# Altium footprint library 04.连接器件.pcb.PCBLIB: 363 footprints (part 1 of 23) (continued)
## 1P - 方形 - 下缺 [mm] "触摸按键" (continued)
  rectangle: 5.004,-4.494 5.111,-4.235
  rectangle: 5.089,-4.422 5.201,-4.247
  rectangle: 5.331,-4.064 5.534,-3.873
  rectangle: 5.22,-4.19 5.41,-3.869
  rectangle: 5.393,-4.122 5.466,-4.039
  rectangle: 5.631,-3.571 6.046,-3.201
  rectangle: 6.009,-3.471 6.169,-3.21
  rectangle: 6.146,-3.343 6.277,-3.219
  rectangle: 5.66,-3.735 5.889,-3.542
  rectangle: 5.849,-3.641 5.958,-3.528
  rectangle: 5.66,-3.833 5.795,-3.735
  rectangle: 5.48,-3.994 5.606,-3.851
  rectangle: 4.103,-5.182 4.417,-4.895
  rectangle: 4.133,-5.33 4.332,-5.164
  rectangle: 4.371,-5.097 4.567,-4.926
  rectangle: 5.09,-3.275 6.333,-2.98
  lines w0.127: -6.45,-1.651 -6.45,-1.884 ; -6.395,-2.522 -6.395,-2.691 ; -4.064,-5.33 -4.123,-5.33 -5.655,-3.797 -6.395,-3.058 -6.395,-2.951 ; -2.423,-5.408 -2.926,-5.408 ; 6.423,-3.174 4.188,-5.408 -4.216,-5.408 ; -6.45,-2.485 -6.45,-3.174 -5.105,-4.519 -4.216,-5.408 ; -6.45,-2.485 -6.45,-1.884 ; -6.45,-2.485 -5.803,-3.132 -3.527,-5.408 ; -6.45,-1.884 -2.926,-5.408 ; -6.395,-2.951 -5.424,-3.921 -3.98,-5.366 -3.856,-5.366 ; -6.395,-2.951 -6.395,-2.827 ; -6.395,-2.827 -5.62,-3.602 -3.856,-5.366 ; -6.395,-2.827 -6.395,-2.691 ; -6.395,-2.691 -5.777,-3.309 -3.72,-5.366 -3.608,-5.366 -3.856,-5.366 ; -4.216,-5.408 -3.527,-5.408 ; -3.527,-5.408 -2.926,-5.408
  lines w0.4: 1.851,-4.532 ccw(c1.93,-3.996) 2.465,-4.075 ; 1.865,-4.486 ccw(c2.102,-3.687) 2.901,-3.924 ; 2.159,-4.438 ccw(c2.491,-3.288) 3.641,-3.621
  lines w0.5: -3.483,-0.201 cw(c0.424,-0.023) 0.246,3.883 ; -3.48,-0.798 ccw(c0.466,-0.45) 0.814,-4.396 ; -3.124,2.795 ccw(c0.928,0.061) -1.024,-4.42 ; -2.598,2.95 cw(c0.025,0.527) -1.554,3.73 ; -1.271,3.929 ccw(c0.722,-0.156) -1.073,-4.333 ; -0.124,3.872 cw(c-0.367,0.086) 3.42,-0.157 ; 0.549,3.954 cw(c-0.023,0.556) 2.921,2.346 ; 0.766,-4.196 ccw(c-0.479,-0.476) 3.431,-0.154 ; 1.357,4.002 cw(c-1.014,-0.135) 1.616,-4.112 ; 2.921,2.363 cw(c-0.852,-0.254) 3.701,-0.848
  lines w0.8: -3.647,0.584 cw(c-0.022,0.275) 3.555,0.943 ; -3.628,1.459 -3.628,-1.477 -3.598,-1.507 ; -3.594,-1.407 ccw(c-0.017,-0.739) 3.591,-1.212 ; -2.117,-4.668 -2.062,-4.723 1.933,-4.723 ; -2.102,4.087 -1.93,4.259 1.838,4.259 ; 3.436,1.807 3.59,1.653 3.59,-1.226

## 1P - 方形 - 右下缺 [mm] "触摸按键"
TopLayer:
  circle w0.4: c0.273,-0.163 r4.195
  region: 4.495,-3.908 4.324,-3.908 4.324,-4.075 4.495,-4.075
  region: 4.829,-3.597 4.675,-3.597 4.675,-3.705 4.829,-3.705
  region: 4.925,-3.507 4.682,-3.507 4.682,-3.615 4.925,-3.615
  region: 4.993,-3.419 4.69,-3.419 4.69,-3.526 4.993,-3.526
  region: 4.709,-3.696 4.526,-3.696 4.526,-3.866 4.709,-3.866
  region: 4.575,-3.645 4.306,-3.645 4.306,-3.936 4.575,-3.936
  region: 3.685,-4.759 3.502,-4.759 3.502,-4.868 3.685,-4.868
  region: 3.817,-4.573 3.679,-4.573 3.679,-4.734 3.817,-4.734
  region: 3.725,-4.589 3.536,-4.589 3.536,-4.783 3.725,-4.783
  region: 4.084,-4.341 3.936,-4.341 3.936,-4.448 4.084,-4.448
  region: 4.199,-4.213 3.941,-4.213 3.941,-4.364 4.199,-4.364
  region: 4.28,-4.138 4.199,-4.138 4.199,-4.213 4.28,-4.213
  region: 4.246,-3.993 3.857,-3.993 3.857,-4.278 4.246,-4.278
  region: 4.369,-3.802 4.07,-3.802 4.07,-4.167 4.369,-4.167
  region: 3.959,-4.447 3.891,-4.447 3.891,-4.534 3.959,-4.534
  region: 3.912,-4.056 3.446,-4.056 3.446,-4.629 3.912,-4.629
  region: 3.996,-4.138 3.727,-4.138 3.727,-4.493 3.996,-4.493
  region: 3.199,-5.206 2.746,-5.206 2.746,-5.349 3.199,-5.349
  region: 3.496,-4.925 3.482,-4.925 3.482,-4.966 3.496,-4.966
  region: 3.467,-4.913 3.219,-4.913 3.219,-5.139 3.467,-5.139
  region: 3.307,-4.874 2.591,-4.874 2.591,-5.262 3.307,-5.262
  region: 3.564,-4.283 2.733,-4.283 2.733,-4.96 3.564,-4.96
  region: 5.249,-3.154 5.037,-3.154 5.037,-3.33 5.249,-3.33
  region: 5.484,-2.947 5.321,-2.947 5.321,-3.067 5.484,-3.067
  region: 5.605,-2.836 5.421,-2.836 5.421,-2.947 5.605,-2.947
  region: 5.672,-2.742 5.414,-2.742 5.414,-2.849 5.672,-2.849
  region: 5.733,-2.578 5.347,-2.578 5.347,-2.771 5.733,-2.771
  region: 6.321,-2.077 6.163,-2.077 6.163,-2.237 6.321,-2.237
  region: 6.202,-2.063 5.972,-2.063 5.972,-2.378 6.202,-2.378
  region: 5.852,-2.578 5.733,-2.578 5.733,-2.667 5.852,-2.667
  region: 5.943,-2.481 5.679,-2.481 5.679,-2.603 5.943,-2.603
  region: 6.053,-2.044 5.673,-2.044 5.673,-2.51 6.053,-2.51
  region: 6.522,-1.896 6.347,-1.896 6.347,-2.053 6.522,-2.053
  region: 6.698,-1.497 6.513,-1.497 6.513,-1.852 6.698,-1.852
  region: 6.597,-1.563 6.399,-1.563 6.399,-1.948 6.597,-1.948
  region: 6.399,-1.563 5.639,-1.563 5.639,-2.112 6.399,-2.112
  region: 2.431,-4.533 -1.735,-4.533 -1.735,-4.699 2.431,-4.699
  region: 2.382,4.388 -1.88,4.388 -1.88,4.092 2.382,4.092
  region: 2.316,-4.663 2.316,-4.168 -1.728,-4.168 -1.728,-4.663
  region: 3.641,-4.306 3.641,-3.766 2.06,-3.766 2.06,-4.306
  region: 5.107,-3.451 5.107,-2.889 3.248,-2.889 3.248,-3.451
  region: 5.367,-3.182 5.367,-2.616 3.672,-2.616 3.672,-3.182
  region: 4.156,-2.698 4.156,-2.419 3.837,-2.419 3.837,-2.698
  region: 4.782,-2.173 4.782,-1.743 4.207,-1.743 4.207,-2.173
  region: 4.768,-1.871 4.768,-0.775 4.339,-0.775 4.339,-1.871
  region: 5.49,-2.968 5.49,-2.712 5.293,-2.712 5.293,-2.968
  region: 4.339,-3.862 4.339,-3.369 2.823,-3.369 2.823,-3.862
  region: 4.741,-3.739 4.741,-3.346 4.248,-3.346 4.248,-3.739
  region: 4.125,-4.072 4.125,-3.652 3.526,-3.652 3.526,-4.072
  region: 2.919,-3.835 2.919,-3.657 2.718,-3.657 2.718,-3.835
  region: 4.764,0.636 4.764,3.289 4.289,3.289 4.289,0.636
  region: 4.841,0.289 4.841,0.974 4.426,0.974 4.426,0.289
  region: 5.499,1.919 5.499,2.705 4.691,2.705 4.691,1.919
  region: 5.262,2.613 5.262,3.152 4.617,3.152 4.617,2.613
  region: 4.343,1.869 4.343,3.792 3.782,3.792 3.782,1.869
  region: 4.422,1.508 4.422,2.011 4.102,2.011 4.102,1.508
  region: 4.617,3.152 4.617,3.499 4.166,3.499 4.166,3.152
  region: -3.799,0.96 -3.799,1.417 -4.155,1.417 -4.155,0.96
  region: -3.201,-2.785 -3.201,-2.36 -5.187,-2.36 -5.187,-2.785
  region: -2.927,-3.15 -2.927,-2.744 -4.941,-2.744 -4.941,-3.15
  region: -2.534,-3.556 -2.534,-3.104 -4.589,-3.104 -4.589,-3.556
  region: -2.201,-3.753 -2.201,-3.552 -4.091,-3.552 -4.091,-3.753
  region: -2.128,-3.885 -2.128,-3.579 -3.749,-3.579 -3.749,-3.885
  region: -1.808,-4.064 -1.808,-3.748 -3,-3.748 -3,-4.064
  region: -2.406,-3.579 -2.406,-3.488 -2.694,-3.488 -2.694,-3.579
  region: -1.351,-4.168 -1.351,-4.004 -1.867,-4.004 -1.867,-4.168
  region: -1.529,-4.401 -1.529,-3.922 -2.141,-3.922 -2.141,-4.401
  region: -3.425,1.933 -3.425,2.69 -5.231,2.69 -5.231,1.933
  region: -3.137,2.248 -3.137,2.764 -5.041,2.764 -5.041,2.248
  region: -3.278,2.079 -3.278,2.335 -3.493,2.335 -3.493,2.079
  region: -2.648,2.668 -2.648,3.116 -4.717,3.116 -4.717,2.668
  region: -2.927,2.509 -2.927,2.828 -3.292,2.828 -3.292,2.509
  region: -2.342,3.024 -2.342,3.413 -4.224,3.413 -4.224,3.024
  region: -1.753,3.308 -1.753,3.773 -3.927,3.773 -3.927,3.308
  region: -1.315,3.645 -1.315,3.956 -3.027,3.956 -3.027,3.645
  region: 2.298,3.938 2.298,4.335 -1.767,4.335 -1.767,3.938
  region: 3.837,2.545 3.837,3.995 3.239,3.995 3.239,2.545
  region: 3.887,2.401 3.887,2.673 3.686,2.673 3.686,2.401
  region: 2.901,3.81 2.901,4.162 1.845,4.162 1.845,3.81
  region: 3.353,3.691 3.353,4.002 2.129,4.002 2.129,3.691
  region: 3.334,3.147 3.334,3.883 2.613,3.883 2.613,3.147
  region: 2.713,3.463 2.713,3.938 2.298,3.938 2.298,3.463
  region: 3.389,2.988 3.389,3.266 3.115,3.266 3.115,2.988
  region: 3.442,3.828 3.442,4.152 2.796,4.152 2.796,3.828
  region: 5.769,5.098 4,5.098 4,-2.7 5.769,-2.7
  region: -3.485,1.933 -5.231,1.933 -5.231,-3.045 -3.485,-3.045
  region: 4.001,5.097 1.483,5.097 1.483,3.634 4.001,3.634
  region: 1.715,5.097 -5.231,5.097 -5.231,3.935 1.715,3.935
  region: -2.91,3.935 -5.231,3.935 -5.231,2.69 -2.91,2.69
  region: 2.792,-3.884 1.814,-3.884 1.814,-5.401 2.792,-5.401
  region: 1.814,-4.138 -4.235,-4.138 -4.235,-5.401 1.814,-5.401
  region: -4.235,-3.045 -5.231,-3.045 -5.231,-5.401 -4.235,-5.401
  region: -3.037,-3.166 -4.561,-3.166 -4.561,-4.458 -3.037,-4.458
  region: -5.231,5.098 -6.231,5.098 -6.231,-5.401 -5.231,-5.401
  region: 6.769,5.098 5.769,5.098 5.769,-1.625 6.769,-1.625
  region: 6.674,-1.925 6.121,-1.925 6.121,-2.495 6.674,-2.495
  region: 6.538,-2.467 5.986,-2.467 5.986,-2.58 6.538,-2.58
  region: 6.463,-2.553 5.906,-2.553 5.906,-2.701 6.463,-2.701
  region: 6.341,-2.68 5.827,-2.68 5.827,-2.822 6.341,-2.822
  region: 6.241,-2.794 5.682,-2.794 5.682,-2.942 6.241,-2.942
  region: 5.874,-2.745 5.785,-2.745 5.785,-2.813 5.874,-2.813
  region: 4.967,-3.599 4.351,-3.599 4.351,-4.217 4.967,-4.217
  region: 5.411,-3.108 4.919,-3.108 4.919,-3.794 5.411,-3.794
  region: 5.798,-2.865 5.291,-2.865 5.291,-3.325 5.798,-3.325
  region: 5.717,-3.306 5.353,-3.306 5.353,-3.386 5.717,-3.386
  region: 5.65,-3.376 5.379,-3.376 5.379,-3.459 5.65,-3.459
  region: 5.584,-3.451 5.375,-3.451 5.375,-3.518 5.584,-3.518
  region: 5.522,-3.507 5.36,-3.507 5.36,-3.589 5.522,-3.589
  region: 5.489,-3.57 5.36,-3.57 5.36,-3.589 5.489,-3.589
  region: 5.459,-3.579 5.363,-3.579 5.363,-3.642 5.459,-3.642
  region: 6.083,-2.897 5.761,-2.897 5.761,-3.014 6.083,-3.014
  region: 6.031,-2.992 5.762,-2.992 5.762,-3.058 6.031,-3.058
  region: 5.984,-3.046 5.764,-3.046 5.764,-3.114 5.984,-3.114
  region: 5.926,-3.107 5.757,-3.107 5.757,-3.177 5.926,-3.177
  region: 5.89,-3.159 5.755,-3.159 5.755,-3.239 5.89,-3.239
  region: 6.125,-2.897 6.083,-2.897 6.083,-2.961 6.125,-2.961
  region: 5.278,-3.76 4.914,-3.76 4.914,-3.895 5.278,-3.895
  region: 5.164,-3.873 4.906,-3.873 4.906,-3.966 5.164,-3.966
  region: 5.098,-3.944 4.875,-3.944 4.875,-4.074 5.098,-4.074
  region: 4.816,-4.194 4.199,-4.194 4.199,-4.364 4.816,-4.364
  region: 4.683,-4.343 4.091,-4.343 4.091,-4.482 4.683,-4.482
  region: 4.565,-4.463 4.03,-4.463 4.03,-4.571 4.565,-4.571
  region: 4.483,-4.555 3.899,-4.555 3.899,-4.692 4.483,-4.692
  region: 4.343,-4.672 3.783,-4.672 3.783,-4.805 4.343,-4.805
  region: 4.243,-4.787 3.678,-4.787 3.678,-4.9 4.243,-4.9
  region: 4.153,-4.88 3.604,-4.88 3.604,-4.984 4.153,-4.984
  region: 4.058,-4.97 3.484,-4.97 3.484,-5.107 4.058,-5.107
  region: 3.946,-5.09 3.375,-5.09 3.375,-5.203 3.946,-5.203
  region: 3.843,-5.182 3.298,-5.182 3.298,-5.305 3.843,-5.305
  lines w0.127: 2.678,-5.337 3.181,-5.337 ; 4.319,-5.259 4.378,-5.259 5.911,-3.726 6.651,-2.987 6.651,-2.88 ; 6.651,-2.451 6.651,-2.62 ; 6.706,-1.58 6.706,-1.813 ; 3.181,-5.337 6.706,-1.813 ; 3.181,-5.337 3.782,-5.337 ; 3.782,-5.337 4.471,-5.337 5.36,-4.448 6.706,-3.103 6.706,-2.414 ; 3.782,-5.337 6.059,-3.061 6.706,-2.414 ; 4.112,-5.295 4.236,-5.295 5.68,-3.85 6.651,-2.88 ; 4.112,-5.295 3.863,-5.295 3.976,-5.295 6.032,-3.238 6.651,-2.62 ; 4.112,-5.295 5.875,-3.531 6.651,-2.756 ; 6.651,-2.88 6.651,-2.756 ; 6.651,-2.756 6.651,-2.62 ; 6.706,-2.414 6.706,-1.813
  lines w0.4: -3.386,-3.55 ccw(c-2.236,-3.217) -1.904,-4.367 ; -2.646,-3.853 ccw(c-1.847,-3.616) -1.609,-4.415 ; -2.21,-4.004 ccw(c-1.674,-3.925) -1.595,-4.461
  lines w0.5: -3.446,-0.777 cw(c1.107,-0.183) -2.665,2.434 ; -3.175,-0.083 ccw(c0.734,-0.405) -0.511,-4.125 ; -3.164,-0.086 cw(c0.622,0.157) 0.379,3.943 ; -2.665,2.417 cw(c0.278,0.627) -0.294,4.025 ; -1.361,-4.041 cw(c1.27,-0.064) -1.102,4.073 ; -0.559,-4.325 ccw(c-0.211,-0.379) 3.736,-0.727 ; 0.01,3.954 cw(c-0.168,0.048) 3.738,-0.13 ; 1.279,-4.349 ccw(c-0.673,0.132) 3.379,2.866 ; 1.328,-4.262 ccw(c-0.466,-0.085) 1.526,4 ; 1.809,3.801 cw(c0.231,0.598) 2.853,3.021
  lines w0.8: -3.336,-1.141 ccw(c0.272,-0.668) 3.849,-1.336 ; -3.334,-1.155 -3.334,1.724 -3.181,1.878 ; -3.3,1.014 cw(c0.277,0.346) 3.903,0.655 ; -1.677,-4.652 2.318,-4.652 2.372,-4.597 ; -1.583,4.33 2.185,4.33 2.357,4.158 ; 3.853,-1.436 3.884,-1.406 3.884,1.53

## 1P - 方形 - 左下缺 [mm] "触摸按键"
TopLayer:
  circle w0.4: c-0.018,-0.234 r4.195
  rectangle: -4.24,-4.146 -4.069,-3.979
  rectangle: -4.574,-3.776 -4.42,-3.668
  rectangle: -4.669,-3.686 -4.427,-3.578
  rectangle: -4.737,-3.597 -4.435,-3.49
  rectangle: -4.454,-3.937 -4.271,-3.767
  rectangle: -4.32,-4.007 -4.05,-3.716
  rectangle: -3.43,-4.939 -3.247,-4.83
  rectangle: -3.561,-4.805 -3.424,-4.644
  rectangle: -3.47,-4.854 -3.281,-4.66
  rectangle: -3.828,-4.519 -3.681,-4.412
  rectangle: -3.944,-4.435 -3.686,-4.284
  rectangle: -4.025,-4.284 -3.944,-4.209
  rectangle: -3.991,-4.349 -3.602,-4.064
  rectangle: -4.114,-4.238 -3.815,-3.873
  rectangle: -3.704,-4.605 -3.636,-4.518
  rectangle: -3.657,-4.7 -3.191,-4.127
  rectangle: -3.741,-4.564 -3.472,-4.209
  rectangle: -2.944,-5.42 -2.491,-5.277
  rectangle: -3.24,-5.037 -3.226,-4.996
  rectangle: -3.211,-5.21 -2.964,-4.984
  rectangle: -3.052,-5.333 -2.335,-4.945
  rectangle: -3.309,-5.031 -2.478,-4.354
  rectangle: -4.993,-3.401 -4.782,-3.225
  rectangle: -5.229,-3.138 -5.066,-3.018
  rectangle: -5.349,-3.018 -5.166,-2.907
  rectangle: -5.417,-2.92 -5.158,-2.813
  rectangle: -5.477,-2.842 -5.092,-2.649
  rectangle: -6.065,-2.308 -5.908,-2.148
  rectangle: -5.947,-2.449 -5.716,-2.134
  rectangle: -5.597,-2.738 -5.477,-2.649
  rectangle: -5.688,-2.674 -5.423,-2.552
  rectangle: -5.798,-2.581 -5.418,-2.115
  rectangle: -6.267,-2.124 -6.092,-1.967
  rectangle: -6.443,-1.923 -6.257,-1.568
  rectangle: -6.342,-2.019 -6.144,-1.634
  rectangle: -6.144,-2.183 -5.383,-1.634
  rectangle: -2.176,-4.77 1.99,-4.604
  rectangle: -2.126,4.021 2.135,4.317
  region: 1.984,-4.734 1.984,-4.239 -2.061,-4.239 -2.061,-4.734
  region: -1.805,-4.377 -1.805,-3.837 -3.385,-3.837 -3.385,-4.377
  region: -2.993,-3.522 -2.993,-2.96 -4.851,-2.96 -4.851,-3.522
  region: -3.417,-3.253 -3.417,-2.687 -5.112,-2.687 -5.112,-3.253
  region: -3.581,-2.769 -3.581,-2.49 -3.901,-2.49 -3.901,-2.769
  region: -3.951,-2.244 -3.951,-1.814 -4.527,-1.814 -4.527,-2.244
  region: -4.084,-1.942 -4.084,-0.846 -4.513,-0.846 -4.513,-1.942
  region: -5.038,-3.039 -5.038,-2.783 -5.235,-2.783 -5.235,-3.039
  region: -2.568,-3.933 -2.568,-3.44 -4.084,-3.44 -4.084,-3.933
  region: -3.992,-3.81 -3.992,-3.417 -4.486,-3.417 -4.486,-3.81
  region: -3.271,-4.143 -3.271,-3.723 -3.869,-3.723 -3.869,-4.143
  region: -2.463,-3.906 -2.463,-3.728 -2.663,-3.728 -2.663,-3.906
  region: -4.034,0.565 -4.034,3.218 -4.509,3.218 -4.509,0.565
  region: -4.171,0.218 -4.171,0.903 -4.586,0.903 -4.586,0.218
  region: -4.435,1.848 -4.435,2.634 -5.244,2.634 -5.244,1.848
  region: -4.362,2.542 -4.362,3.081 -5.006,3.081 -5.006,2.542
  region: -3.527,1.798 -3.527,3.721 -4.088,3.721 -4.088,1.798
  region: -3.846,1.437 -3.846,1.94 -4.166,1.94 -4.166,1.437
  region: -3.91,3.081 -3.91,3.428 -4.362,3.428 -4.362,3.081
  region: 4.411,0.889 4.411,1.346 4.055,1.346 4.055,0.889
  region: 5.442,-2.856 5.442,-2.431 3.456,-2.431 3.456,-2.856
  region: 5.196,-3.221 5.196,-2.815 3.182,-2.815 3.182,-3.221
  region: 4.844,-3.627 4.844,-3.175 2.789,-3.175 2.789,-3.627
  region: 4.347,-3.824 4.347,-3.623 2.456,-3.623 2.456,-3.824
  region: 4.004,-3.956 4.004,-3.65 2.383,-3.65 2.383,-3.956
  region: 3.255,-4.135 3.255,-3.819 2.063,-3.819 2.063,-4.135
  region: 2.949,-3.65 2.949,-3.559 2.661,-3.559 2.661,-3.65
  region: 2.123,-4.239 2.123,-4.075 1.606,-4.075 1.606,-4.239
  region: 2.397,-4.472 2.397,-3.993 1.785,-3.993 1.785,-4.472
  region: 5.486,1.862 5.486,2.619 3.68,2.619 3.68,1.862
  region: 5.297,2.177 5.297,2.693 3.392,2.693 3.392,2.177
  region: 3.748,2.008 3.748,2.264 3.534,2.264 3.534,2.008
  region: 4.972,2.597 4.972,3.045 2.903,3.045 2.903,2.597
  region: 3.547,2.438 3.547,2.757 3.182,2.757 3.182,2.438
  region: 4.479,2.953 4.479,3.342 2.598,3.342 2.598,2.953
  region: 4.182,3.237 4.182,3.702 2.008,3.702 2.008,3.237
  region: 3.283,3.574 3.283,3.885 1.57,3.885 1.57,3.574
  region: 2.022,3.867 2.022,4.264 -2.042,4.264 -2.042,3.867
  region: -2.983,2.474 -2.983,3.924 -3.582,3.924 -3.582,2.474
  region: -3.431,2.33 -3.431,2.602 -3.632,2.602 -3.632,2.33
  region: -1.59,3.739 -1.59,4.091 -2.645,4.091 -2.645,3.739
  region: -1.873,3.62 -1.873,3.931 -3.097,3.931 -3.097,3.62
  region: -2.357,3.076 -2.357,3.812 -3.079,3.812 -3.079,3.076
  region: -2.042,3.392 -2.042,3.867 -2.458,3.867 -2.458,3.392
  region: -2.86,2.917 -2.86,3.195 -3.134,3.195 -3.134,2.917
  region: -2.54,3.757 -2.54,4.081 -3.186,4.081 -3.186,3.757
  rectangle: -5.514,-2.771 -3.745,5.027
  rectangle: 3.74,-3.116 5.486,1.862
  rectangle: -3.745,3.563 -1.228,5.026
  rectangle: -1.46,3.864 5.486,5.026
  rectangle: 3.166,2.619 5.486,3.864
  rectangle: -2.537,-5.472 -1.559,-3.955
  rectangle: -1.559,-5.472 4.491,-4.209
  rectangle: 4.491,-5.472 5.486,-3.116
  rectangle: 3.293,-4.529 4.816,-3.237
  rectangle: 5.486,-5.472 6.486,5.027
  rectangle: -6.514,-1.696 -5.514,5.027
  rectangle: -6.419,-2.566 -5.866,-1.996
  rectangle: -6.283,-2.651 -5.731,-2.538
  rectangle: -6.207,-2.772 -5.651,-2.624
  rectangle: -6.086,-2.893 -5.571,-2.751
  rectangle: -5.985,-3.013 -5.426,-2.865
  rectangle: -5.619,-2.884 -5.53,-2.816
  rectangle: -4.712,-4.288 -4.096,-3.67
  rectangle: -5.155,-3.865 -4.664,-3.179
  rectangle: -5.543,-3.396 -5.036,-2.936
  rectangle: -5.462,-3.457 -5.098,-3.377
  rectangle: -5.395,-3.53 -5.124,-3.447
  rectangle: -5.329,-3.589 -5.12,-3.522
  rectangle: -5.267,-3.66 -5.104,-3.578
  rectangle: -5.234,-3.66 -5.104,-3.641
  rectangle: -5.204,-3.713 -5.107,-3.65
  rectangle: -5.828,-3.085 -5.506,-2.968
  rectangle: -5.776,-3.129 -5.507,-3.063
  rectangle: -5.729,-3.185 -5.509,-3.117
  rectangle: -5.67,-3.248 -5.502,-3.178
  rectangle: -5.635,-3.31 -5.499,-3.23
  rectangle: -5.87,-3.032 -5.828,-2.968
  rectangle: -5.022,-3.966 -4.658,-3.831
  rectangle: -4.908,-4.037 -4.651,-3.944
  rectangle: -4.843,-4.145 -4.62,-4.015
  rectangle: -4.561,-4.435 -3.944,-4.265
  rectangle: -4.428,-4.553 -3.836,-4.414
  rectangle: -4.309,-4.642 -3.775,-4.534
  rectangle: -4.228,-4.763 -3.643,-4.626
  rectangle: -4.087,-4.876 -3.528,-4.743
  rectangle: -3.988,-4.971 -3.423,-4.858
  rectangle: -3.898,-5.055 -3.349,-4.951
  rectangle: -3.803,-5.178 -3.229,-5.041
  rectangle: -3.691,-5.274 -3.119,-5.161
  rectangle: -3.587,-5.376 -3.043,-5.253
  lines w0.127: -6.45,-1.651 -6.45,-1.884 ; -6.395,-2.522 -6.395,-2.691 ; -4.064,-5.33 -4.123,-5.33 -5.655,-3.797 -6.395,-3.058 -6.395,-2.951 ; -2.423,-5.408 -2.926,-5.408 ; -6.45,-2.485 -6.45,-3.174 -5.105,-4.519 -4.216,-5.408 -3.527,-5.408 ; -6.45,-2.485 -6.45,-1.884 ; -6.45,-2.485 -5.803,-3.132 -3.527,-5.408 ; -6.45,-1.884 -2.926,-5.408 ; -6.395,-2.951 -5.424,-3.921 -3.98,-5.366 -3.856,-5.366 ; -6.395,-2.951 -6.395,-2.827 ; -6.395,-2.827 -5.62,-3.602 -3.856,-5.366 ; -6.395,-2.827 -6.395,-2.691 ; -6.395,-2.691 -5.777,-3.309 -3.72,-5.366 -3.608,-5.366 -3.856,-5.366 ; -3.527,-5.408 -2.926,-5.408
  lines w0.4: 1.851,-4.532 ccw(c1.93,-3.996) 2.465,-4.075 ; 1.865,-4.486 ccw(c2.102,-3.687) 2.901,-3.924 ; 2.159,-4.438 ccw(c2.491,-3.288) 3.641,-3.621
  lines w0.5: -3.483,-0.201 cw(c0.424,-0.023) 0.246,3.883 ; -3.48,-0.798 ccw(c0.466,-0.45) 0.814,-4.396 ; -3.124,2.795 ccw(c0.928,0.061) -1.024,-4.42 ; -2.598,2.95 cw(c0.025,0.527) -1.554,3.73 ; -1.271,3.929 ccw(c0.722,-0.156) -1.073,-4.333 ; -0.124,3.872 cw(c-0.367,0.086) 3.42,-0.157 ; 0.549,3.954 cw(c-0.023,0.556) 2.921,2.346 ; 0.766,-4.196 ccw(c-0.479,-0.476) 3.431,-0.154 ; 1.357,4.002 cw(c-1.014,-0.135) 1.616,-4.112 ; 2.921,2.363 cw(c-0.852,-0.254) 3.701,-0.848
  lines w0.8: -3.647,0.584 cw(c-0.022,0.275) 3.555,0.943 ; -3.628,1.459 -3.628,-1.477 -3.598,-1.507 ; -3.594,-1.407 ccw(c-0.017,-0.739) 3.591,-1.212 ; -2.117,-4.668 -2.062,-4.723 1.933,-4.723 ; -2.102,4.087 -1.93,4.259 1.838,4.259 ; 3.436,1.807 3.59,1.653 3.59,-1.226

## 2P-1.25-SMT [mm]
pads (4):
  rect 2.1x3 smd: 0(-3.165,-1.448) 0(3.165,-1.448)
  rect 0.5x1.6 smd: 1(0.625,1.448) 2(-0.625,1.448)
TopOverlay:
  lines w0.1: -2.075,-3.052 -4.275,-3.052 -4.275,0.148 -2.075,0.148 ; 2.025,-3.052 4.325,-3.052 4.325,0.148 2.025,0.148 ; 2.025,0.148 2.025,0.548 -2.075,0.548 -2.075,-3.452 2.025,-3.452 2.025,0.148
3D body: height 0.5, standoff 0, extent -2.075,-3.452 2.025,0.548
3D body: height 4, standoff 3.5, extent -2.075,-3.452 2.025,0.648
3D body: height 4, standoff 0, extent -2.075,0.248 1.925,0.548
3D body: height 4, standoff 0, extent -2.075,-3.452 -1.775,0.548
3D body: height 4, standoff 0, extent 1.725,-3.452 2.025,0.548
3D body: height 2, standoff 0, extent -4.305,-3.052 -2.005,0.148
3D body: height 2, standoff 0, extent 2.025,-3.052 4.325,0.148
3D body: height 0.3, standoff 0, extent -0.975,0.048 -0.264,2.261
3D body: height 0.3, standoff 0, extent 0.269,0.048 0.981,2.261

## 2P-2.0-SMT [mm]
pads (4):
  rect 1.6x3.4 smd: 0(-3.55,2.9) 0(3.55,2.9)
  rect 1x3.2 smd: 1(1,-2.9) 2(-1,-2.9)
TopOverlay:
  lines w0.1: -2.93,4.628 4,4.628 4,-4.25 3,-4.25 3,-1.265 -0.25,-1.265 ; -0.219,-1.265 -3,-1.265 -3,-4.25 -4,-4.25 -4,4.628 2.93,4.628
3D body: height 3.2, standoff 0, extent 3.225,-3.238 3.975,-0.975
3D body: height 3.2, standoff 0, extent -4,-3.238 -3.3,-0.975
3D body: height 0.3, standoff 0, extent 0.5,-3.713 1.5,-0.55
3D body: height 0.3, standoff 0, extent -1.5,-3.713 -0.5,-0.55
3D body: height 5.6, standoff 0, extent -4,-1.275 4,4.628

## 2P-51004 [mm]
pads (2):
  rect 1.5x1.5 hole 0.75: 1(-1,0)
  round 1.5 hole 0.75: 2(1,0)
TopOverlay:
  lines w0.1: -0.5,2.866 -0.5,2.54 -2.774,2.54 -2.774,-0.833 -2.282,-1.325 0,-1.325 2.282,-1.325 2.774,-0.833 2.774,2.54 0.5,2.54 0.5,2.866 ; -0.483,2.54 0.467,2.54 ; 3.047,-1.651 -3.1,-1.651 -3.1,2.921 3.047,2.921 ; 3.1,-1.651 3.1,2.921
3D body "510004-2.STEP": height 5.9, standoff -3.47, extent -3.003,-1.565 2.997,2.835

## 2P-A2001WV-S [mm]
pads (4):
  rect 1.6x3 smd: 0(-2.4,2.378) 0(4.4,2.378)
  rect 1x5.5 smd: 1(0,0) 2(2,0)
TopOverlay:
  lines w0.1: -0.778,-0.743 -3,-0.743 -3,0.63 -1.362,0.63 -1.362,4.11 -3,4.11 -3,4.652 5,4.652 5,4.11 3.337,4.11 3.337,0.63 5,0.63 5,-0.743 2.778,-0.741 ; 0.746,-0.741 1.279,-0.743
3D body "A2001WV-2.STEP": height 5.9, standoff -0.25, extent -3,-2.765 5,4.665

## 2P-JC2.0 [mm]
pads (2):
  rect 1.5x1.6 hole 0.9: 1(0,0)
  oval 1.5x1.6 hole 0.9: 2(2,0)
TopOverlay:
  lines w0.1: -0.8,-1.016 -0.362,-1.016 -0.362,-2.235 -0.377,-2.25 -0.8,-2.25 -0.8,0.94 ; 1.2,-2.25 1.623,-2.25 1.638,-2.235 ; 3.67,-2.25 2.349,-2.25 2.349,-0.991 2.857,-0.991 2.857,0.94 1.2,0.94 1.2,-0.991 1.67,-0.991 1.67,-2.25 0.349,-2.25 0.349,-0.991 0.857,-0.991 0.857,0.94 -0.8,0.94 ; 3.67,-0.991 3.111,-0.991 3.111,0.94 3.683,0.94 ; 3.683,3.75 -0.8,3.75 -0.8,0.94 ; 3.7,-2.25 3.7,3.75
  text "1" at -0.178,1.626 h1
3D body "2P-JC2.0.STEP": height 3.4, standoff -3.22, extent -0.8,-7.25 3.7,3.75

## 2P-PH-2.0-90 [mm]
pads (2):
  rect 1.4x1.4 hole 0.8: 1(-1.95,1.35)
  round 1.4 hole 0.8: 2(-3.95,1.35)
TopOverlay:
  lines w0.254: -5.9,2.215 -0.608,2.215 ; -5.3,2.215 -5.3,0 -5.9,0 -5.9,7.6 -4.89,7.6 -4.89,6.431 -3.95,6.431 -3.95,3.104 -1.95,3.104 -1.95,6.457 -1,6.457 -1,7.6 0,7.6 0,0 -0.6,0 -0.6,2.215 ; -0.573,2.215 -0.123,2.215 ; -5.385,3.251 -5.385,4.877 -4.801,4.877 -4.801,3.251 -5.385,3.251 ; -1.118,3.256 -0.533,3.256 -0.533,4.882 -1.118,4.882 -1.118,3.256
3D body: height 5, standoff 0, extent -5.9,0 0,7.6

## 2P-SAN2.0 [mm]
pads (2):
  rect 1.5x1.6 hole 0.9: 1(0,0)
  oval 1.5x1.6 hole 0.9: 2(2,0)
TopOverlay:
  lines w0.1: -0.33,-1.85 -0.33,-1.524 0.457,-1.524 0.457,-1.85 ; 1.67,-1.85 1.67,-1.524 2.457,-1.524 2.457,-1.85 ; -1.6,-1.85 -1.6,1.4 3.6,1.4 3.6,-1.85 -1.6,-1.85
3D body "2P-SAN2.0.STEP": height 11, standoff -3.19, extent -1.6,-1.829 3.6,1.421

## 2P-XH2.5 [mm]
pads (2):
  rect 2x2 hole 0.9: 1(0,0)
  round 2 hole 0.9: 2(2.5,0)
TopOverlay:
  lines w0.254: -1.48,-1.6 -2.48,-1.6 -2.48,-2.3 -0.58,-2.3 ; -1.48,-1 -2.48,-1 -2.48,3.5 5.02,3.5 5.02,-1 4.02,-1 ; -0.88,-2.3 -0.28,-2.3 -0.28,-1.6 ; 0.32,-1.6 0.32,-2.3 0.62,-2.3 1.62,-2.3 2.22,-2.3 2.22,-1.6 ; 2.82,-1.6 2.82,-2.3 3.12,-2.3 5.02,-2.3 5.02,-1.6 4.02,-1.6
3D body "2PIN-XH2.5.STEP": height 5.9, standoff -3.47, extent -2.43,-2.372 4.97,3.378

## 2P-ZH1.5 [mm]
pads (2):
  round 1.1 hole 0.65: 1(0,0) 2(1.5,0)
TopOverlay:
  lines w0.1: -1.499,-0.406 -1.499,-0.203 ; -1.499,0.051 -1.499,0.279 ; -1.295,-0.406 -1.295,-0.203 ; -1.295,0.051 -1.295,0.279 ; 2.667,-1.956 -1.27,-1.956 -1.27,-0.635 -1.5,-0.635 -1.5,-2.25 2.972,-2.25 ; 2.716,-1.956 2.716,-0.635 3,-0.635 ; 2.716,1.118 2.716,0.508 2.946,0.508 3,0.562 3,1.4 ; 2.718,1.118 -1.27,1.118 -1.27,0.508 -1.5,0.508 -1.5,1.4 2.997,1.4 ; 2.742,-0.406 2.742,-0.203 ; 2.742,0.051 2.742,0.279 ; 2.945,-0.406 2.945,-0.203 ; 2.945,0.051 2.945,0.279 ; 3,-2.25 3,-0.682
3D body "2P-ZH1.5.STEP": height 4.6, standoff -2.45, extent -1.524,-2.261 2.976,1.389